# Altium schematic symbol library Capacitor - Aluminium TH.SchLib: 4591 symbols (part 5 of 27) (continued)
## ECA-1AM222B
designator C?, comment 2200uF  (value not drawn)
CAP ALUM 2200UF 20% 10V RADIAL; Part Number: ECA-1AM222B; Manufacturer: Panasonic Electronic Components; TemperatureRange: -40C ~ 85C; Type: Polar; Ripple Current: 920mA @ 120Hz; Value: 2200uF; PartId: 25751; Supplier 1: Digi-Key; Supplier Part Number 1: P10368TB-ND; ComponentLink1Description: Datasheet; ComponentLink1URL: http://industrial.panasonic.com/www-cgi/jvcr13pz.cgi?E+PZ+3+ABA0012+ECA1AM222B+7+WW; ComponentLink2Description: Digi-Key Listing; ComponentLink2URL: https://www.digikey.com/product-detail/en/panasonic-electronic-components/ECA-1AM222B/P10368TB-ND/268453; Tolerance: 20%; Voltage: 10V; Price: 0.2014; Device Package: Radial, Can, 10mm
footprint CAP AL TH D10 L5 H22
pins: 1, 2

## ECA-1AM332
designator C?, comment 3300uF  (value not drawn)
CAP ALUM 3300UF 20% 10V RADIAL; Part Number: ECA-1AM332; Manufacturer: Panasonic Electronic Components; TemperatureRange: -40C ~ 85C; Type: Polar; Ripple Current: 1.09A @ 120Hz; Value: 3300uF; PartId: 23237; Supplier 1: Digi-Key; Supplier Part Number 1: P5129-ND; ComponentLink1Description: Datasheet; ComponentLink1URL: http://industrial.panasonic.com/www-cgi/jvcr13pz.cgi?E+PZ+3+ABA0012+ECA1AM332+7+WW; ComponentLink2Description: Digi-Key Listing; ComponentLink2URL: https://www.digikey.com/product-detail/en/panasonic-electronic-components/ECA-1AM332/P5129-ND/244988; Tolerance: 20%; Voltage: 10V; Price: 0.68; Device Package: Radial, Can, 12.5mm
footprint CAP AL TH D12.5 L5 H22
pins: 1, 2

## ECA-1AM472
designator C?, comment 4700uF  (value not drawn)
CAP ALUM 4700UF 20% 10V RADIAL; Part Number: ECA-1AM472; Manufacturer: Panasonic Electronic Components; TemperatureRange: -40C ~ 85C; Type: Polar; Ripple Current: 1.2A @ 120Hz; Value: 4700uF; PartId: 23886; Supplier 1: Digi-Key; Supplier Part Number 1: P5130-ND; ComponentLink1Description: Datasheet; ComponentLink1URL: http://industrial.panasonic.com/www-cgi/jvcr13pz.cgi?E+PZ+3+ABA0012+ECA1AM472+7+WW; ComponentLink2Description: Digi-Key Listing; ComponentLink2URL: https://www.digikey.com/product-detail/en/panasonic-electronic-components/ECA-1AM472/P5130-ND/244989; Tolerance: 20%; Voltage: 10V; Price: 0.85; Device Package: Radial, Can, 12.5mm
footprint CAP AL TH D12.5 L5 H27
pins: 1, 2

## ECA-1AM682
designator C?, comment 6800uF  (value not drawn)
CAP ALUM 6800UF 20% 10V RADIAL; Part Number: ECA-1AM682; Manufacturer: Panasonic Electronic Components; TemperatureRange: -40C ~ 85C; Type: Polar; Ripple Current: 1.4A @ 120Hz; Value: 6800uF; PartId: 26850; Supplier 1: Digi-Key; Supplier Part Number 1: P5131-ND; ComponentLink1Description: Datasheet; ComponentLink1URL: http://industrial.panasonic.com/www-cgi/jvcr13pz.cgi?E+PZ+3+ABA0012+ECA1AM682+7+WW; ComponentLink2Description: Digi-Key Listing; ComponentLink2URL: https://www.digikey.com/product-detail/en/panasonic-electronic-components/ECA-1AM682/P5131-ND/244990; Tolerance: 20%; Voltage: 10V; Price: 1.05; Device Package: Radial, Can, 16mm
footprint CAP AL TH D16 L7.5 H27
pins: 1, 2

## ECA-1CHG102
designator C?, comment 1000uF  (value not drawn)
CAP ALUM 1000UF 20% 16V RADIAL; Part Number: ECA-1CHG102; Manufacturer: Panasonic Electronic Components; TemperatureRange: -55C ~ 105C; Type: Polar; Ripple Current: 560mA @ 120Hz; Value: 1000uF; PartId: 25256; Supplier 1: Digi-Key; Supplier Part Number 1: P5533-ND; ComponentLink1Description: Datasheet; ComponentLink1URL: https://industrial.panasonic.com/cdbs/www-data/pdf/RDF0000/ABA0000C1038.pdf; ComponentLink2Description: Digi-Key Listing; ComponentLink2URL: https://www.digikey.com/product-detail/en/panasonic-electronic-components/ECA-1CHG102/P5533-ND/245132; Tolerance: 20%; Voltage: 16V; Price: 0.59; Device Package: Radial, Can, 10mm
footprint CAP AL TH D10 L5 H17.5
pins: 1, 2

## ECA-1CHG102B
designator C?, comment 1000uF  (value not drawn)
CAP ALUM 1000UF 20% 16V RADIAL; Part Number: ECA-1CHG102B; Manufacturer: Panasonic Electronic Components; TemperatureRange: -55C ~ 105C; Type: Polar; Ripple Current: 560mA @ 120Hz; Value: 1000uF; PartId: 25059; Supplier 1: Digi-Key; Supplier Part Number 1: P19511TB-ND; ComponentLink1Description: Datasheet; ComponentLink1URL: https://industrial.panasonic.com/cdbs/www-data/pdf/RDF0000/ABA0000C1038.pdf; ComponentLink2Description: Digi-Key Listing; ComponentLink2URL: https://www.digikey.com/product-detail/en/panasonic-electronic-components/ECA-1CHG102B/P19511TB-ND/1629498; Tolerance: 20%; Voltage: 16V; Price: 0.2186; Device Package: Radial, Can, 10mm
footprint CAP AL TH D10 L5 H17.5
pins: 1, 2

## ECA-1CHG222
designator C?, comment 2200uF  (value not drawn)
CAP ALUM 2200UF 20% 16V RADIAL; Part Number: ECA-1CHG222; Manufacturer: Panasonic Electronic Components; TemperatureRange: -55C ~ 105C; Type: Polar; Ripple Current: 920mA @ 120Hz; Value: 2200uF; PartId: 23329; Supplier 1: Digi-Key; Supplier Part Number 1: P5534-ND; ComponentLink1Description: Datasheet; ComponentLink1URL: https://industrial.panasonic.com/cdbs/www-data/pdf/RDF0000/ABA0000C1038.pdf; ComponentLink2Description: Digi-Key Listing; ComponentLink2URL: https://www.digikey.com/product-detail/en/panasonic-electronic-components/ECA-1CHG222/P5534-ND/245133; Tolerance: 20%; Voltage: 16V; Price: 0.83; Device Package: Radial, Can, 12.5mm
footprint CAP AL TH D12.5 L5 H22
pins: 1, 2

## ECA-1CHG222B
designator C?, comment 2200uF  (value not drawn)
CAP ALUM 2200UF 20% 16V RADIAL; Part Number: ECA-1CHG222B; Manufacturer: Panasonic Electronic Components; TemperatureRange: -55C ~ 105C; Type: Polar; Ripple Current: 920mA @ 120Hz; Value: 2200uF; PartId: 23164; Supplier 1: Digi-Key; Supplier Part Number 1: P19512TB-ND; ComponentLink1Description: Datasheet; ComponentLink1URL: https://industrial.panasonic.com/cdbs/www-data/pdf/RDF0000/ABA0000C1038.pdf; ComponentLink2Description: Digi-Key Listing; ComponentLink2URL: https://www.digikey.com/product-detail/en/panasonic-electronic-components/ECA-1CHG222B/P19512TB-ND/2688645; Tolerance: 20%; Voltage: 16V; Price: 0.3366; Device Package: Radial, Can, 12.5mm
footprint CAP AL TH D12.5 L5 H22
pins: 1, 2

## ECA-1CHG332
designator C?, comment 3300uF  (value not drawn)
CAP ALUM 3300UF 20% 16V RADIAL; Part Number: ECA-1CHG332; Manufacturer: Panasonic Electronic Components; TemperatureRange: -55C ~ 105C; Type: Polar; Ripple Current: 1.17A @ 120Hz; Value: 3300uF; PartId: 23933; Supplier 1: Digi-Key; Supplier Part Number 1: P5535-ND; ComponentLink1Description: Datasheet; ComponentLink1URL: https://industrial.panasonic.com/cdbs/www-data/pdf/RDF0000/ABA0000C1038.pdf; ComponentLink2Description: Digi-Key Listing; ComponentLink2URL: https://www.digikey.com/product-detail/en/panasonic-electronic-components/ECA-1CHG332/P5535-ND/245134; Tolerance: 20%; Voltage: 16V; Price: 0.97; Device Package: Radial, Can, 12.5mm
footprint CAP AL TH D12.5 L5 H27
pins: 1, 2

## ECA-1CHG472
designator C?, comment 4700uF  (value not drawn)
CAP ALUM 4700UF 20% 16V RADIAL; Part Number: ECA-1CHG472; Manufacturer: Panasonic Electronic Components; TemperatureRange: -55C ~ 105C; Type: Polar; Ripple Current: 1.48A @ 120Hz; Value: 4700uF; PartId: 26858; Supplier 1: Digi-Key; Supplier Part Number 1: P5536-ND; ComponentLink1Description: Datasheet; ComponentLink1URL: https://industrial.panasonic.com/cdbs/www-data/pdf/RDF0000/ABA0000C1038.pdf; ComponentLink2Description: Digi-Key Listing; ComponentLink2URL: https://www.digikey.com/product-detail/en/panasonic-electronic-components/ECA-1CHG472/P5536-ND/245135; Tolerance: 20%; Voltage: 16V; Price: 1.22; Device Package: Radial, Can, 16mm
footprint CAP AL TH D16 L7.5 H27
pins: 1, 2

## ECA-1CHG682
designator C?, comment 6800uF  (value not drawn)
CAP ALUM 6800UF 20% 16V RADIAL; Part Number: ECA-1CHG682; Manufacturer: Panasonic Electronic Components; TemperatureRange: -55C ~ 105C; Type: Polar; Ripple Current: 1.78A @ 120Hz; Value: 6800uF; PartId: 27112; Supplier 1: Digi-Key; Supplier Part Number 1: P5537-ND; ComponentLink1Description: Datasheet; ComponentLink1URL: https://industrial.panasonic.com/cdbs/www-data/pdf/RDF0000/ABA0000C1038.pdf; ComponentLink2Description: Digi-Key Listing; ComponentLink2URL: https://www.digikey.com/product-detail/en/panasonic-electronic-components/ECA-1CHG682/P5537-ND/245136; Tolerance: 20%; Voltage: 16V; Price: 1.75; Device Package: Radial, Can, 16mm
footprint CAP AL TH D16 L7.5 H33.5
pins: 1, 2

## ECA-1CM102
designator C?, comment 1000uF  (value not drawn)
CAP ALUM 1000UF 20% 16V RADIAL; Part Number: ECA-1CM102; Manufacturer: Panasonic Electronic Components; TemperatureRange: -40C ~ 85C; Type: Polar; Ripple Current: 680mA @ 120Hz; Value: 1000uF; PartId: 25196; Supplier 1: Digi-Key; Supplier Part Number 1: P5142-ND; ComponentLink1Description: Datasheet; ComponentLink1URL: http://industrial.panasonic.com/www-cgi/jvcr13pz.cgi?E+PZ+3+ABA0012+ECA1CM102+7+WW; ComponentLink2Description: Digi-Key Listing; ComponentLink2URL: https://www.digikey.com/product-detail/en/panasonic-electronic-components/ECA-1CM102/P5142-ND/245001; Tolerance: 20%; Voltage: 16V; Price: 0.5; Device Package: Radial, Can, 10mm
footprint CAP AL TH D10 L5 H17.5
pins: 1, 2

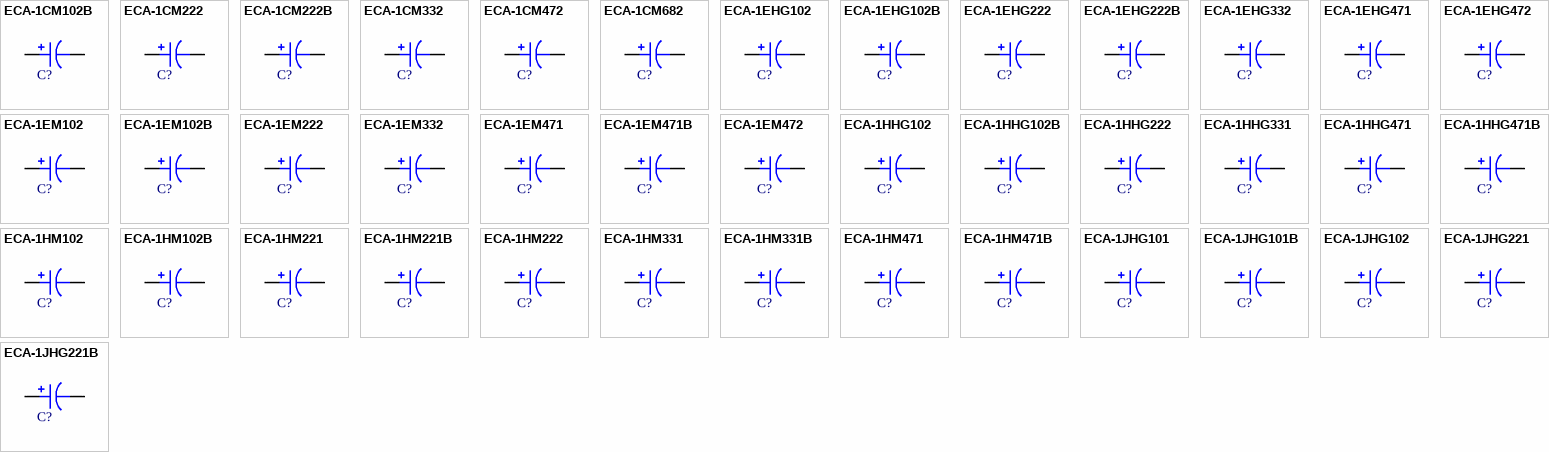
[diagram p20: symbols ECA-1CM102B to ECA-1JHG221B]

## ECA-1CM102B
designator C?, comment 1000uF  (value not drawn)
CAP ALUM 1000UF 20% 16V RADIAL; Part Number: ECA-1CM102B; Manufacturer: Panasonic Electronic Components; TemperatureRange: -40C ~ 85C; Type: Polar; Ripple Current: 680mA @ 120Hz; Value: 1000uF; PartId: 24995; Supplier 1: Digi-Key; Supplier Part Number 1: P10373TB-ND; ComponentLink1Description: Datasheet; ComponentLink1URL: http://industrial.panasonic.com/www-cgi/jvcr13pz.cgi?E+PZ+3+ABA0012+ECA1CM102B+7+WW; ComponentLink2Description: Digi-Key Listing; ComponentLink2URL: https://www.digikey.com/product-detail/en/panasonic-electronic-components/ECA-1CM102B/P10373TB-ND/268458; Tolerance: 20%; Voltage: 16V; Price: 0.142; Device Package: Radial, Can, 10mm
footprint CAP AL TH D10 L5 H17.5
pins: 1, 2

## ECA-1CM222
designator C?, comment 2200uF  (value not drawn)
CAP ALUM 2200UF 20% 16V RADIAL; Part Number: ECA-1CM222; Manufacturer: Panasonic Electronic Components; TemperatureRange: -40C ~ 85C; Type: Polar; Ripple Current: 1A @ 120Hz; Value: 2200uF; PartId: 23218; Supplier 1: Digi-Key; Supplier Part Number 1: P5143-ND; ComponentLink1Description: Datasheet; ComponentLink1URL: http://industrial.panasonic.com/www-cgi/jvcr13pz.cgi?E+PZ+3+ABA0012+ECA1CM222+7+WW; ComponentLink2Description: Digi-Key Listing; ComponentLink2URL: https://www.digikey.com/product-detail/en/panasonic-electronic-components/ECA-1CM222/P5143-ND/245002; Tolerance: 20%; Voltage: 16V; Price: 0.64; Device Package: Radial, Can, 12.5mm
footprint CAP AL TH D12.5 L5 H22
pins: 1, 2

## ECA-1CM222B
designator C?, comment 2200uF  (value not drawn)
CAP ALUM 2200UF 20% 16V RADIAL; Part Number: ECA-1CM222B; Manufacturer: Panasonic Electronic Components; TemperatureRange: -40C ~ 85C; Type: Polar; Ripple Current: 1A @ 120Hz; Value: 2200uF; PartId: 23143; Supplier 1: Digi-Key; Supplier Part Number 1: P10374TB-ND; ComponentLink1Description: Datasheet; ComponentLink1URL: http://industrial.panasonic.com/www-cgi/jvcr13pz.cgi?E+PZ+3+ABA0012+ECA1CM222B+7+WW; ComponentLink2Description: Digi-Key Listing; ComponentLink2URL: https://www.digikey.com/product-detail/en/panasonic-electronic-components/ECA-1CM222B/P10374TB-ND/268459; Tolerance: 20%; Voltage: 16V; Price: 0.2734; Device Package: Radial, Can, 12.5mm
footprint CAP AL TH D12.5 L5 H22
pins: 1, 2

## ECA-1CM332
designator C?, comment 3300uF  (value not drawn)
CAP ALUM 3300UF 20% 16V RADIAL; Part Number: ECA-1CM332; Manufacturer: Panasonic Electronic Components; TemperatureRange: -40C ~ 85C; Type: Polar; Ripple Current: 1.2A @ 120Hz; Value: 3300uF; PartId: 23866; Supplier 1: Digi-Key; Supplier Part Number 1: P5144-ND; ComponentLink1Description: Datasheet; ComponentLink1URL: http://industrial.panasonic.com/www-cgi/jvcr13pz.cgi?E+PZ+3+ABA0012+ECA1CM332+7+WW; ComponentLink2Description: Digi-Key Listing; ComponentLink2URL: https://www.digikey.com/product-detail/en/panasonic-electronic-components/ECA-1CM332/P5144-ND/245003; Tolerance: 20%; Voltage: 16V; Price: 0.78; Device Package: Radial, Can, 12.5mm
footprint CAP AL TH D12.5 L5 H27
pins: 1, 2

## ECA-1CM472
designator C?, comment 4700uF  (value not drawn)
CAP ALUM 4700UF 20% 16V RADIAL; Part Number: ECA-1CM472; Manufacturer: Panasonic Electronic Components; TemperatureRange: -40C ~ 85C; Type: Polar; Ripple Current: 1.36A @ 120Hz; Value: 4700uF; PartId: 26826; Supplier 1: Digi-Key; Supplier Part Number 1: P5145-ND; ComponentLink1Description: Datasheet; ComponentLink1URL: http://industrial.panasonic.com/www-cgi/jvcr13pz.cgi?E+PZ+3+ABA0012+ECA1CM472+7+WW; ComponentLink2Description: Digi-Key Listing; ComponentLink2URL: https://www.digikey.com/product-detail/en/panasonic-electronic-components/ECA-1CM472/P5145-ND/245004; Tolerance: 20%; Voltage: 16V; Price: 0.98; Device Package: Radial, Can, 16mm
footprint CAP AL TH D16 L7.5 H27
pins: 1, 2

## ECA-1CM682
designator C?, comment 6800uF  (value not drawn)
CAP ALUM 6800UF 20% 16V RADIAL; Part Number: ECA-1CM682; Manufacturer: Panasonic Electronic Components; TemperatureRange: -40C ~ 85C; Type: Polar; Ripple Current: 1.6A @ 120Hz; Value: 6800uF; PartId: 26994; Supplier 1: Digi-Key; Supplier Part Number 1: P5146-ND; ComponentLink1Description: Datasheet; ComponentLink1URL: http://industrial.panasonic.com/www-cgi/jvcr13pz.cgi?E+PZ+3+ABA0012+ECA1CM682+7+WW; ComponentLink2Description: Digi-Key Listing; ComponentLink2URL: https://www.digikey.com/product-detail/en/panasonic-electronic-components/ECA-1CM682/P5146-ND/245005; Tolerance: 20%; Voltage: 16V; Price: 1.31; Device Package: Radial, Can, 16mm
footprint CAP AL TH D16 L7.5 H33.5
pins: 1, 2

## ECA-1EHG102
designator C?, comment 1000uF  (value not drawn)
CAP ALUM 1000UF 20% 25V RADIAL; Part Number: ECA-1EHG102; Manufacturer: Panasonic Electronic Components; TemperatureRange: -55C ~ 105C; Type: Polar; Ripple Current: 680mA @ 120Hz; Value: 1000uF; PartId: 25874; Supplier 1: Digi-Key; Supplier Part Number 1: P5544-ND; ComponentLink1Description: Datasheet; ComponentLink1URL: http://industrial.panasonic.com/www-cgi/jvcr13pz.cgi?E+PZ+3+ABA0026+ECA1EHG102+7+WW; ComponentLink2Description: Digi-Key Listing; ComponentLink2URL: https://www.digikey.com/product-detail/en/panasonic-electronic-components/ECA-1EHG102/P5544-ND/245143; Tolerance: 20%; Voltage: 25V; Price: 0.64; Device Package: Radial, Can, 10mm
footprint CAP AL TH D10 L5 H22
pins: 1, 2

## ECA-1EHG102B
designator C?, comment 1000uF  (value not drawn)
CAP ALUM 1000UF 20% 25V RADIAL; Part Number: ECA-1EHG102B; Manufacturer: Panasonic Electronic Components; TemperatureRange: -55C ~ 105C; Type: Polar; Ripple Current: 680mA @ 120Hz; Value: 1000uF; PartId: 25795; Supplier 1: Digi-Key; Supplier Part Number 1: P19517TB-ND; ComponentLink1Description: Datasheet; ComponentLink1URL: http://industrial.panasonic.com/www-cgi/jvcr13pz.cgi?E+PZ+3+ABA0026+ECA1EHG102B+7+WW; ComponentLink2Description: Digi-Key Listing; ComponentLink2URL: https://www.digikey.com/product-detail/en/panasonic-electronic-components/ECA-1EHG102B/P19517TB-ND/2688664; Tolerance: 20%; Voltage: 25V; Price: 0.2734; Device Package: Radial, Can, 10mm
footprint CAP AL TH D10 L5 H22
pins: 1, 2

## ECA-1EHG222
designator C?, comment 2200uF  (value not drawn)
CAP ALUM 2200UF 20% 25V RADIAL; Part Number: ECA-1EHG222; Manufacturer: Panasonic Electronic Components; TemperatureRange: -55C ~ 105C; Type: Polar; Ripple Current: 1.09A @ 120Hz; Value: 2200uF; PartId: 23932; Supplier 1: Digi-Key; Supplier Part Number 1: P5545-ND; ComponentLink1Description: Datasheet; ComponentLink1URL: http://industrial.panasonic.com/www-cgi/jvcr13pz.cgi?E+PZ+3+ABA0026+ECA1EHG222+7+WW; ComponentLink2Description: Digi-Key Listing; ComponentLink2URL: https://www.digikey.com/product-detail/en/panasonic-electronic-components/ECA-1EHG222/P5545-ND/245144; Tolerance: 20%; Voltage: 25V; Price: 0.97; Device Package: Radial, Can, 12.5mm
footprint CAP AL TH D12.5 L5 H27
pins: 1, 2

## ECA-1EHG222B
designator C?, comment 2200uF  (value not drawn)
CAP ALUM 2200UF 20% 25V RADIAL; Part Number: ECA-1EHG222B; Manufacturer: Panasonic Electronic Components; TemperatureRange: -55C ~ 105C; Type: Polar; Ripple Current: 1.09A @ 120Hz; Value: 2200uF; PartId: 23818; Supplier 1: Digi-Key; Supplier Part Number 1: P19519TB-ND; ComponentLink1Description: Datasheet; ComponentLink1URL: http://industrial.panasonic.com/www-cgi/jvcr13pz.cgi?E+PZ+3+ABA0026+ECA1EHG222B+7+WW; ComponentLink2Description: Digi-Key Listing; ComponentLink2URL: https://www.digikey.com/product-detail/en/panasonic-electronic-components/ECA-1EHG222B/P19519TB-ND/2688667; Tolerance: 20%; Voltage: 25V; Price: 0.4279; Device Package: Radial, Can, 12.5mm
footprint CAP AL TH D12.5 L5 H27
pins: 1, 2

## ECA-1EHG332
designator C?, comment 3300uF  (value not drawn)
CAP ALUM 3300UF 20% 25V RADIAL; Part Number: ECA-1EHG332; Manufacturer: Panasonic Electronic Components; TemperatureRange: -55C ~ 105C; Type: Polar; Ripple Current: 1.4A @ 120Hz; Value: 3300uF; PartId: 26863; Supplier 1: Digi-Key; Supplier Part Number 1: P5546-ND; ComponentLink1Description: Datasheet; ComponentLink1URL: http://industrial.panasonic.com/www-cgi/jvcr13pz.cgi?E+PZ+3+ABA0026+ECA1EHG332+7+WW; ComponentLink2Description: Digi-Key Listing; ComponentLink2URL: https://www.digikey.com/product-detail/en/panasonic-electronic-components/ECA-1EHG332/P5546-ND/245145; Tolerance: 20%; Voltage: 25V; Price: 1.25; Device Package: Radial, Can, 16mm
footprint CAP AL TH D16 L7.5 H27
pins: 1, 2

## ECA-1EHG471
designator C?, comment 470uF  (value not drawn)
CAP ALUM 470UF 20% 25V RADIAL; Part Number: ECA-1EHG471; Manufacturer: Panasonic Electronic Components; TemperatureRange: -55C ~ 105C; Type: Polar; Ripple Current: 380mA @ 120Hz; Value: 470uF; PartId: 24918; Supplier 1: Digi-Key; Supplier Part Number 1: P5543-ND; ComponentLink1Description: Datasheet; ComponentLink1URL: http://industrial.panasonic.com/www-cgi/jvcr13pz.cgi?E+PZ+3+ABA0026+ECA1EHG471+7+WW; ComponentLink2Description: Digi-Key Listing; ComponentLink2URL: https://www.digikey.com/product-detail/en/panasonic-electronic-components/ECA-1EHG471/P5543-ND/245142; Tolerance: 20%; Voltage: 25V; Price: 0.5; Device Package: Radial, Can, 10mm
footprint CAP AL TH D10 L5 H14.5
pins: 1, 2

## ECA-1EHG472
designator C?, comment 4700uF  (value not drawn)
CAP ALUM 4700UF 20% 25V RADIAL; Part Number: ECA-1EHG472; Manufacturer: Panasonic Electronic Components; TemperatureRange: -55C ~ 105C; Type: Polar; Ripple Current: 1.75A @ 120Hz; Value: 4700uF; PartId: 27079; Supplier 1: Digi-Key; Supplier Part Number 1: P5547-ND; ComponentLink1Description: Datasheet; ComponentLink1URL: http://industrial.panasonic.com/www-cgi/jvcr13pz.cgi?E+PZ+3+ABA0026+ECA1EHG472+7+WW; ComponentLink2Description: Digi-Key Listing; ComponentLink2URL: https://www.digikey.com/product-detail/en/panasonic-electronic-components/ECA-1EHG472/P5547-ND/245146; Tolerance: 20%; Voltage: 25V; Price: 1.68; Device Package: Radial, Can, 16mm
footprint CAP AL TH D16 L7.5 H33.5
pins: 1, 2

## ECA-1EM102
designator C?, comment 1000uF  (value not drawn)
CAP ALUM 1000UF 20% 25V RADIAL; Part Number: ECA-1EM102; Manufacturer: Panasonic Electronic Components; TemperatureRange: -40C ~ 85C; Type: Polar; Ripple Current: 850mA @ 120Hz; Value: 1000uF; PartId: 25858; Supplier 1: Digi-Key; Supplier Part Number 1: P5156-ND; ComponentLink1Description: Datasheet; ComponentLink1URL: http://industrial.panasonic.com/www-cgi/jvcr13pz.cgi?E+PZ+3+ABA0012+ECA1EM102+7+WW; ComponentLink2Description: Digi-Key Listing; ComponentLink2URL: https://www.digikey.com/product-detail/en/panasonic-electronic-components/ECA-1EM102/P5156-ND/245015; Tolerance: 20%; Voltage: 25V; Price: 0.59; Device Package: Radial, Can, 10mm
footprint CAP AL TH D10 L5 H22
pins: 1, 2

## ECA-1EM102B
designator C?, comment 1000uF  (value not drawn)
CAP ALUM 1000UF 20% 25V RADIAL; Part Number: ECA-1EM102B; Manufacturer: Panasonic Electronic Components; TemperatureRange: -40C ~ 85C; Type: Polar; Ripple Current: 850mA @ 120Hz; Value: 1000uF; PartId: 25741; Supplier 1: Digi-Key; Supplier Part Number 1: P10380TB-ND; ComponentLink1Description: Datasheet; ComponentLink1URL: http://industrial.panasonic.com/www-cgi/jvcr13pz.cgi?E+PZ+3+ABA0012+ECA1EM102B+7+WW; ComponentLink2Description: Digi-Key Listing; ComponentLink2URL: https://www.digikey.com/product-detail/en/panasonic-electronic-components/ECA-1EM102B/P10380TB-ND/268465; Tolerance: 20%; Voltage: 25V; Price: 0.1942; Device Package: Radial, Can, 10mm
footprint CAP AL TH D10 L5 H22
pins: 1, 2

## ECA-1EM222
designator C?, comment 2200uF  (value not drawn)
CAP ALUM 2200UF 20% 25V RADIAL; Part Number: ECA-1EM222; Manufacturer: Panasonic Electronic Components; TemperatureRange: -40C ~ 85C; Type: Polar; Ripple Current: 1.2A @ 120Hz; Value: 2200uF; PartId: 23863; Supplier 1: Digi-Key; Supplier Part Number 1: P5157-ND; ComponentLink1Description: Datasheet; ComponentLink1URL: http://industrial.panasonic.com/www-cgi/jvcr13pz.cgi?E+PZ+3+ABA0012+ECA1EM222+7+WW; ComponentLink2Description: Digi-Key Listing; ComponentLink2URL: https://www.digikey.com/product-detail/en/panasonic-electronic-components/ECA-1EM222/P5157-ND/245016; Tolerance: 20%; Voltage: 25V; Price: 0.78; Device Package: Radial, Can, 12.5mm
footprint CAP AL TH D12.5 L5 H27
pins: 1, 2

## ECA-1EM332
designator C?, comment 3300uF  (value not drawn)
CAP ALUM 3300UF 20% 25V RADIAL; Part Number: ECA-1EM332; Manufacturer: Panasonic Electronic Components; TemperatureRange: -40C ~ 85C; Type: Polar; Ripple Current: 1.3A @ 120Hz; Value: 3300uF; PartId: 26830; Supplier 1: Digi-Key; Supplier Part Number 1: P5158-ND; ComponentLink1Description: Datasheet; ComponentLink1URL: http://industrial.panasonic.com/www-cgi/jvcr13pz.cgi?E+PZ+3+ABA0012+ECA1EM332+7+WW; ComponentLink2Description: Digi-Key Listing; ComponentLink2URL: https://www.digikey.com/product-detail/en/panasonic-electronic-components/ECA-1EM332/P5158-ND/245017; Tolerance: 20%; Voltage: 25V; Price: 0.98; Device Package: Radial, Can, 16mm
footprint CAP AL TH D16 L7.5 H27
pins: 1, 2

## ECA-1EM471
designator C?, comment 470uF  (value not drawn)
CAP ALUM 470UF 20% 25V RADIAL; Part Number: ECA-1EM471; Manufacturer: Panasonic Electronic Components; TemperatureRange: -40C ~ 85C; Type: Polar; Ripple Current: 480mA @ 120Hz; Value: 470uF; PartId: 24775; Supplier 1: Digi-Key; Supplier Part Number 1: P5155-ND; ComponentLink1Description: Datasheet; ComponentLink1URL: http://industrial.panasonic.com/www-cgi/jvcr13pz.cgi?E+PZ+3+ABA0012+ECA1EM471+7+WW; ComponentLink2Description: Digi-Key Listing; ComponentLink2URL: https://www.digikey.com/product-detail/en/panasonic-electronic-components/ECA-1EM471/P5155-ND/245014; Tolerance: 20%; Voltage: 25V; Price: 0.44; Device Package: Radial, Can, 10mm
footprint CAP AL TH D10 L5 H14.5
pins: 1, 2

## ECA-1EM471B
designator C?, comment 470uF  (value not drawn)
CAP ALUM 470UF 20% 25V RADIAL; Part Number: ECA-1EM471B; Manufacturer: Panasonic Electronic Components; TemperatureRange: -40C ~ 85C; Type: Polar; Ripple Current: 480mA @ 120Hz; Value: 470uF; PartId: 24521; Supplier 1: Digi-Key; Supplier Part Number 1: P10379TB-ND; ComponentLink1Description: Datasheet; ComponentLink1URL: http://industrial.panasonic.com/www-cgi/jvcr13pz.cgi?E+PZ+3+ABA0012+ECA1EM471B+7+WW; ComponentLink2Description: Digi-Key Listing; ComponentLink2URL: https://www.digikey.com/product-detail/en/panasonic-electronic-components/ECA-1EM471B/P10379TB-ND/268464; Tolerance: 20%; Voltage: 25V; Price: 0.1392; Device Package: Radial, Can, 10mm
footprint CAP AL TH D10 L5 H14.5
pins: 1, 2

## ECA-1EM472
designator C?, comment 4700uF  (value not drawn)
CAP ALUM 4700UF 20% 25V RADIAL; Part Number: ECA-1EM472; Manufacturer: Panasonic Electronic Components; TemperatureRange: -40C ~ 85C; Type: Polar; Ripple Current: 1.5A @ 120Hz; Value: 4700uF; PartId: 26998; Supplier 1: Digi-Key; Supplier Part Number 1: P5159-ND; ComponentLink1Description: Datasheet; ComponentLink1URL: http://industrial.panasonic.com/www-cgi/jvcr13pz.cgi?E+PZ+3+ABA0012+ECA1EM472+7+WW; ComponentLink2Description: Digi-Key Listing; ComponentLink2URL: https://www.digikey.com/product-detail/en/panasonic-electronic-components/ECA-1EM472/P5159-ND/245018; Tolerance: 20%; Voltage: 25V; Price: 1.34; Device Package: Radial, Can, 16mm
footprint CAP AL TH D16 L7.5 H33.5
pins: 1, 2

## ECA-1HHG102
designator C?, comment 1000uF  (value not drawn)
CAP ALUM 1000UF 20% 50V RADIAL; Part Number: ECA-1HHG102; Manufacturer: Panasonic Electronic Components; TemperatureRange: -55C ~ 105C; Type: Polar; Ripple Current: 950mA @ 120Hz; Value: 1000uF; PartId: 23951; Supplier 1: Digi-Key; Supplier Part Number 1: P5575-ND; ComponentLink1Description: Datasheet; ComponentLink1URL: https://industrial.panasonic.com/cdbs/www-data/pdf/RDF0000/ABA0000C1038.pdf; ComponentLink2Description: Digi-Key Listing; ComponentLink2URL: https://www.digikey.com/product-detail/en/panasonic-electronic-components/ECA-1HHG102/P5575-ND/245174; Tolerance: 20%; Voltage: 50V; Price: 0.98; Device Package: Radial, Can, 12.5mm
footprint CAP AL TH D12.5 L5 H27
pins: 1, 2

## ECA-1HHG102B
designator C?, comment 1000uF  (value not drawn)
CAP ALUM 1000UF 20% 50V RADIAL; Part Number: ECA-1HHG102B; Manufacturer: Panasonic Electronic Components; TemperatureRange: -55C ~ 105C; Type: Polar; Ripple Current: 950mA @ 120Hz; Value: 1000uF; PartId: 24018; Supplier 1: Digi-Key; Supplier Part Number 1: P19524CT-ND; ComponentLink1Description: Datasheet; ComponentLink1URL: https://industrial.panasonic.com/cdbs/www-data/pdf/RDF0000/ABA0000C1038.pdf; ComponentLink2Description: Digi-Key Listing; ComponentLink2URL: https://www.digikey.com/product-detail/en/panasonic-electronic-components/ECA-1HHG102B/P19524CT-ND/6109422; Tolerance: 20%; Voltage: 50V; Price: 1.07; Device Package: Radial, Can, 12.5mm
footprint CAP AL TH D12.5 L5 H27
pins: 1, 2

## ECA-1HHG222
designator C?, comment 2200uF  (value not drawn)
CAP ALUM 2200UF 20% 50V RADIAL; Part Number: ECA-1HHG222; Manufacturer: Panasonic Electronic Components; TemperatureRange: -55C ~ 105C; Type: Polar; Ripple Current: 1.47A @ 120Hz; Value: 2200uF; PartId: 27067; Supplier 1: Digi-Key; Supplier Part Number 1: P5576-ND; ComponentLink1Description: Datasheet; ComponentLink1URL: https://industrial.panasonic.com/cdbs/www-data/pdf/RDF0000/ABA0000C1038.pdf; ComponentLink2Description: Digi-Key Listing; ComponentLink2URL: https://www.digikey.com/product-detail/en/panasonic-electronic-components/ECA-1HHG222/P5576-ND/245175; Tolerance: 20%; Voltage: 50V; Price: 1.64; Device Package: Radial, Can, 16mm
footprint CAP AL TH D16 L7.5 H33.5
pins: 1, 2

## ECA-1HHG331
designator C?, comment 330uF  (value not drawn)
CAP ALUM 330UF 20% 50V RADIAL; Part Number: ECA-1HHG331; Manufacturer: Panasonic Electronic Components; TemperatureRange: -55C ~ 105C; Type: Polar; Ripple Current: 410mA @ 120Hz; Value: 330uF; PartId: 25258; Supplier 1: Digi-Key; Supplier Part Number 1: P5573-ND; ComponentLink1Description: Datasheet; ComponentLink1URL: https://industrial.panasonic.com/cdbs/www-data/pdf/RDF0000/ABA0000C1038.pdf; ComponentLink2Description: Digi-Key Listing; ComponentLink2URL: https://www.digikey.com/product-detail/en/panasonic-electronic-components/ECA-1HHG331/P5573-ND/245172; Tolerance: 20%; Voltage: 50V; Price: 0.59; Device Package: Radial, Can, 10mm
footprint CAP AL TH D10 L5 H17.5
pins: 1, 2

## ECA-1HHG471
designator C?, comment 470uF  (value not drawn)
CAP ALUM 470UF 20% 50V RADIAL; Part Number: ECA-1HHG471; Manufacturer: Panasonic Electronic Components; TemperatureRange: -55C ~ 105C; Type: Polar; Ripple Current: 530mA @ 120Hz; Value: 470uF; PartId: 25873; Supplier 1: Digi-Key; Supplier Part Number 1: P5574-ND; ComponentLink1Description: Datasheet; ComponentLink1URL: https://industrial.panasonic.com/cdbs/www-data/pdf/RDF0000/ABA0000C1038.pdf; ComponentLink2Description: Digi-Key Listing; ComponentLink2URL: https://www.digikey.com/product-detail/en/panasonic-electronic-components/ECA-1HHG471/P5574-ND/245173; Tolerance: 20%; Voltage: 50V; Price: 0.64; Device Package: Radial, Can, 10mm
footprint CAP AL TH D10 L5 H22
pins: 1, 2

## ECA-1HHG471B
designator C?, comment 470uF  (value not drawn)
CAP ALUM 470UF 20% 50V RADIAL; Part Number: ECA-1HHG471B; Manufacturer: Panasonic Electronic Components; TemperatureRange: -55C ~ 105C; Type: Polar; Ripple Current: 530mA @ 120Hz; Value: 470uF; PartId: 25796; Supplier 1: Digi-Key; Supplier Part Number 1: P19527TB-ND; ComponentLink1Description: Datasheet; ComponentLink1URL: https://industrial.panasonic.com/cdbs/www-data/pdf/RDF0000/ABA0000C1038.pdf; ComponentLink2Description: Digi-Key Listing; ComponentLink2URL: https://www.digikey.com/product-detail/en/panasonic-electronic-components/ECA-1HHG471B/P19527TB-ND/2688700; Tolerance: 20%; Voltage: 50V; Price: 0.2734; Device Package: Radial, Can, 10mm
footprint CAP AL TH D10 L5 H22
pins: 1, 2

## ECA-1HM102
designator C?, comment 1000uF  (value not drawn)
CAP ALUM 1000UF 20% 50V RADIAL; Part Number: ECA-1HM102; Manufacturer: Panasonic Electronic Components; TemperatureRange: -40C ~ 85C; Type: Polar; Ripple Current: 1.05A @ 120Hz; Value: 1000uF; PartId: 23870; Supplier 1: Digi-Key; Supplier Part Number 1: P5186-ND; ComponentLink1Description: Datasheet; ComponentLink1URL: http://industrial.panasonic.com/www-cgi/jvcr13pz.cgi?E+PZ+3+ABA0012+ECA1HM102+7+WW; ComponentLink2Description: Digi-Key Listing; ComponentLink2URL: https://www.digikey.com/product-detail/en/panasonic-electronic-components/ECA-1HM102/P5186-ND/245045; Tolerance: 20%; Voltage: 50V; Price: 0.81; Device Package: Radial, Can, 12.5mm
footprint CAP AL TH D12.5 L5 H27
pins: 1, 2

## ECA-1HM102B
designator C?, comment 1000uF  (value not drawn)
CAP ALUM 1000UF 20% 50V RADIAL; Part Number: ECA-1HM102B; Manufacturer: Panasonic Electronic Components; TemperatureRange: -40C ~ 85C; Type: Polar; Ripple Current: 1.05A @ 120Hz; Value: 1000uF; PartId: 23804; Supplier 1: Digi-Key; Supplier Part Number 1: P19529TB-ND; ComponentLink1Description: Datasheet; ComponentLink1URL: http://industrial.panasonic.com/www-cgi/jvcr13pz.cgi?E+PZ+3+ABA0012+ECA1HM102B+7+WW; ComponentLink2Description: Digi-Key Listing; ComponentLink2URL: https://www.digikey.com/product-detail/en/panasonic-electronic-components/ECA-1HM102B/P19529TB-ND/2688712; Tolerance: 20%; Voltage: 50V; Price: 0.3625; Device Package: Radial, Can, 12.5mm
footprint CAP AL TH D12.5 L5 H27
pins: 1, 2

## ECA-1HM221
designator C?, comment 220uF  (value not drawn)
CAP ALUM 220UF 20% 50V RADIAL; Part Number: ECA-1HM221; Manufacturer: Panasonic Electronic Components; TemperatureRange: -40C ~ 85C; Type: Polar; Ripple Current: 400mA @ 120Hz; Value: 220uF; PartId: 24845; Supplier 1: Digi-Key; Supplier Part Number 1: P5183-ND; ComponentLink1Description: Datasheet; ComponentLink1URL: http://industrial.panasonic.com/www-cgi/jvcr13pz.cgi?E+PZ+3+ABA0012+ECA1HM221+7+WW; ComponentLink2Description: Digi-Key Listing; ComponentLink2URL: https://www.digikey.com/product-detail/en/panasonic-electronic-components/ECA-1HM221/P5183-ND/245042; Tolerance: 20%; Voltage: 50V; Price: 0.47; Device Package: Radial, Can, 10mm
footprint CAP AL TH D10 L5 H14.5
pins: 1, 2

## ECA-1HM221B
designator C?, comment 220uF  (value not drawn)
CAP ALUM 220UF 20% 50V RADIAL; Part Number: ECA-1HM221B; Manufacturer: Panasonic Electronic Components; TemperatureRange: -40C ~ 85C; Type: Polar; Ripple Current: 400mA @ 120Hz; Value: 220uF; PartId: 24570; Supplier 1: Digi-Key; Supplier Part Number 1: P10398TB-ND; ComponentLink1Description: Datasheet; ComponentLink1URL: http://industrial.panasonic.com/www-cgi/jvcr13pz.cgi?E+PZ+3+ABA0012+ECA1HM221B+7+WW; ComponentLink2Description: Digi-Key Listing; ComponentLink2URL: https://www.digikey.com/product-detail/en/panasonic-electronic-components/ECA-1HM221B/P10398TB-ND/268483; Tolerance: 20%; Voltage: 50V; Price: 0.1554; Device Package: Radial, Can, 10mm
footprint CAP AL TH D10 L5 H14.5
pins: 1, 2

## ECA-1HM222
designator C?, comment 2200uF  (value not drawn)
CAP ALUM 2200UF 20% 50V RADIAL; Part Number: ECA-1HM222; Manufacturer: Panasonic Electronic Components; TemperatureRange: -40C ~ 85C; Type: Polar; Ripple Current: 1.3A @ 120Hz; Value: 2200uF; PartId: 27012; Supplier 1: Digi-Key; Supplier Part Number 1: P5187-ND; ComponentLink1Description: Datasheet; ComponentLink1URL: http://industrial.panasonic.com/www-cgi/jvcr13pz.cgi?E+PZ+3+ABA0012+ECA1HM222+7+WW; ComponentLink2Description: Digi-Key Listing; ComponentLink2URL: https://www.digikey.com/product-detail/en/panasonic-electronic-components/ECA-1HM222/P5187-ND/245046; Tolerance: 20%; Voltage: 50V; Price: 1.42; Device Package: Radial, Can, 16mm
footprint CAP AL TH D16 L7.5 H33.5
pins: 1, 2

## ECA-1HM331
designator C?, comment 330uF  (value not drawn)
CAP ALUM 330UF 20% 50V RADIAL; Part Number: ECA-1HM331; Manufacturer: Panasonic Electronic Components; TemperatureRange: -40C ~ 85C; Type: Polar; Ripple Current: 500mA @ 120Hz; Value: 330uF; PartId: 25153; Supplier 1: Digi-Key; Supplier Part Number 1: P5184-ND; ComponentLink1Description: Datasheet; ComponentLink1URL: http://industrial.panasonic.com/www-cgi/jvcr13pz.cgi?E+PZ+3+ABA0012+ECA1HM331+7+WW; ComponentLink2Description: Digi-Key Listing; ComponentLink2URL: https://www.digikey.com/product-detail/en/panasonic-electronic-components/ECA-1HM331/P5184-ND/245043; Tolerance: 20%; Voltage: 50V; Price: 0.43; Device Package: Radial, Can, 10mm
footprint CAP AL TH D10 L5 H17.5
pins: 1, 2

## ECA-1HM331B
designator C?, comment 330uF  (value not drawn)